# Altium footprint library d1_PcbLib.PcbLib: 266 footprints (part 2 of 17)
Each footprint in its own frame and in the unit in brackets; x right, y up, seen from the top. Pads: shape width x height; smd on the part's side, far side on the other; paste and mask are expansions set on the pad; w line width, h text height; cw(c..) or ccw(c..) is an arc to the next point about the centre after c.
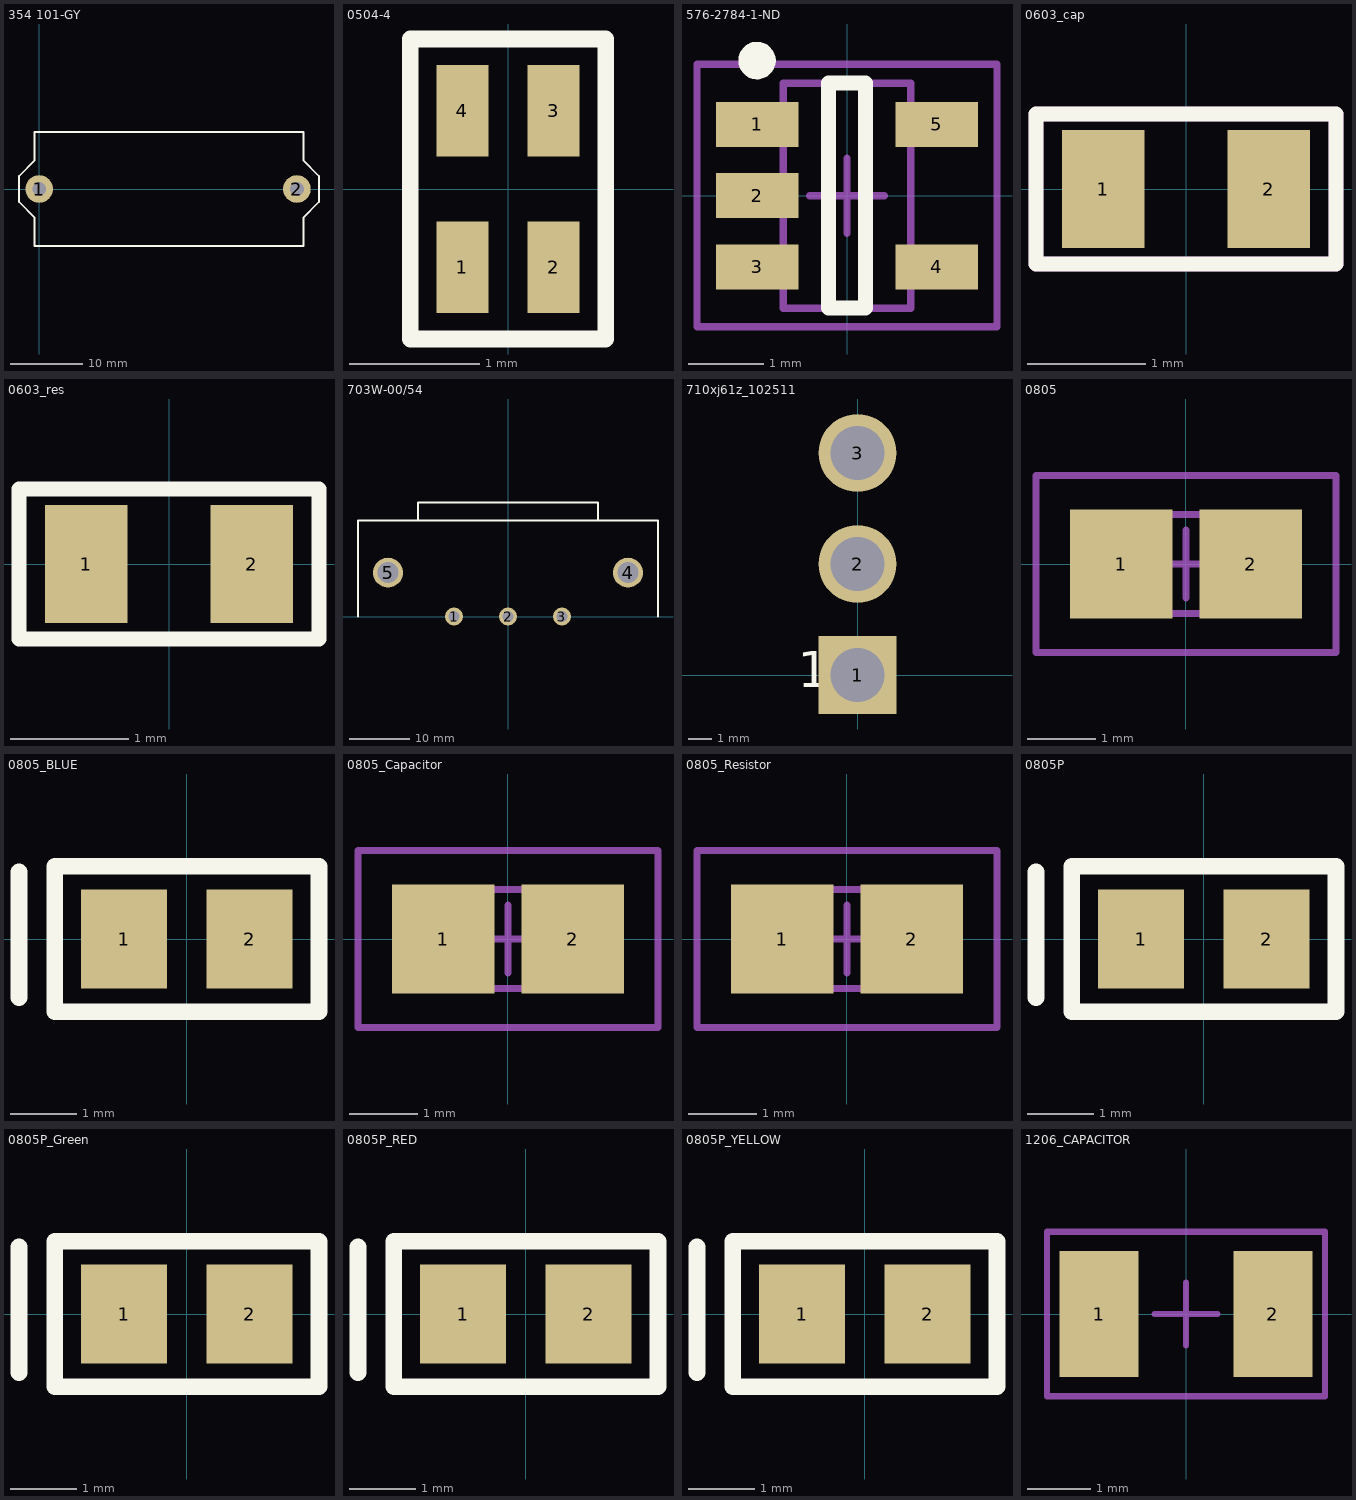
[diagram p1: the footprints below, top view; thin cyan lines are the x and y axes]

## 354 101-GY [mm]
pads (2):
  round 3.81 hole 1.905: 1(0,0) 2(35.56,0)
Top Overlay:
  lines w0.254: -2.794,-1.778 -0.635,-3.937 -0.635,-7.874 36.449,-7.874 36.449,-3.937 38.608,-1.778 38.608,1.778 36.449,3.937 36.449,7.874 -0.635,7.874 -0.635,3.937 -2.794,1.778 -2.794,-1.778
3D body: height 13.46, standoff 0, extent -0.635,-7.938 36.449,7.938

## 0504-4 [mm]
pads (4):
  rect 0.4x0.7 smd: 1(-0.35,-0.6) 2(0.35,-0.6) 3(0.35,0.6) 4(-0.35,0.6)
Top Overlay:
  lines w0.127: -0.75,-1.15 0.75,-1.15 0.75,1.15 -0.75,1.15 -0.75,-1.15

## 576-2784-1-ND [mm] "SOT23, 5-Leads, Body 3.0x3.0mm (max), Pitch 0.95mm, IPC Medium Density"
height 1.45
pads (5):
  rect 1.1x0.6 smd: 1(-1.2,0.95) 2(-1.2,0) 3(-1.2,-0.95) 4(1.2,-0.95) 5(1.2,0.95)
Top Overlay:
  circle w0.25: c-1.2,1.8 r0.125
  lines w0.2: -0.25,-1.5 0.25,-1.5 0.25,1.5 -0.25,1.5 -0.25,-1.5
Mechanical 13:
  lines w0.1: -0.85,-1.5 -0.85,1.5 0.85,1.5 0.85,-1.5 -0.85,-1.5
Mechanical 15:
  lines w0.1: -0.5,0 0.5,0 ; 0,-0.5 0,0.5 ; -2,-1.75 -2,1.75 2,1.75 2,-1.75 -2,-1.75
3D body: height 1.45, standoff 0.15, extent -0.85,-1.5 0.85,1.5

## 0603_cap [mm]
pads (2):
  rect 0.7x1 smd: 1(-0.7,0) 2(0.7,0)
Top Overlay:
  lines w0.127: -1.27,-0.635 1.27,-0.635 1.27,0.635 -1.27,0.635 -1.27,-0.635
Mechanical 15:
  lines w0.127: -1.27,-0.635 1.27,-0.635 1.27,0.635 -1.27,0.635 -1.27,-0.635
3D body: height 0.3, standoff 0, extent -0.8,-0.4 0.8,0.4

## 0603_res [mm]
pads (2):
  rect 0.7x1 smd: 1(-0.7,0) 2(0.7,0)
Top Overlay:
  lines w0.127: -1.27,-0.635 1.27,-0.635 1.27,0.635 -1.27,0.635 -1.27,-0.635
Mechanical 15:
  lines w0.1: -1.27,-0.635 -1.27,0.635 1.27,0.635 1.27,-0.635 -1.27,-0.635
3D body: height 0.3, standoff 0, extent -0.8,-0.4 0.8,0.4

## 703W-00/54 [mm]
pads (5):
  round 3 hole 1.8: 1(-9,0) 2(0,0) 3(9,0)
  round 5 hole 3.5: 4(20,7.3) 5(-20,7.3)
Top Overlay:
  lines w0.254: -25,0 -25,16 25,16 25,0 ; -15,16 -15,19 15,19 15,16

## 710xj61z_102511 [mil]
pads (3):
  rect 130x130 hole 90: 1(0,0)
  round 130 hole 90: 2(0,185) 3(0,370)
Top Overlay:
  text "1" at -100,-20 h60
3D body: height 1234.02, standoff -85, extent -307.5,-198.5 307.5,566.5

## 0805 [mm] "0805 Resistor/Capacitor"
height 1.1
pads (2):
  rect 1.5x1.6 smd: 1(-0.95,0) 2(0.95,0)
Mechanical 13:
  lines w0.1: -1.1,-0.725 1.1,-0.725 1.1,0.725 -1.1,0.725 -1.1,-0.725
Mechanical 15:
  lines w0.1: -0.5,0 0.5,0 ; 0,-0.5 0,0.5 ; -2.2,-1.3 2.2,-1.3 2.2,1.3 -2.2,1.3 -2.2,-1.3
3D body: height 0.78, standoff 0, extent -1,-0.625 1,0.625

## 0805_BLUE [mm] "Chip Capacitor; Body 2.0 x 1.2 mm (LxW typ)"
height 1.3
pads (2):
  rect 1.3x1.5 smd: 1(-0.95,0) 2(0.95,0)
Top Overlay:
  lines w0.254: -2.54,-0.889 -2.54,1.016 ; -2,-1.1 -2,1.1 2,1.1 2,-1.1 0.9,-1.1 -0.9,-1.1 -2,-1.1
3D body: height 0.79, standoff 0, extent -1.016,-0.635 0.991,0.61

## 0805_Capacitor [mm] "0805 Capacitor"
height 1.1
pads (2):
  rect 1.5x1.6 smd: 1(-0.95,0) 2(0.95,0)
Mechanical 13:
  lines w0.1: -1.1,-0.725 -1.1,0.725 1.1,0.725 1.1,-0.725 -1.1,-0.725
Mechanical 15:
  lines w0.1: -0.5,0 0.5,0 ; 0,-0.5 0,0.5 ; -2.2,-1.3 -2.2,1.3 2.2,1.3 2.2,-1.3 -2.2,-1.3
3D body: height 0.76, standoff -0.03, extent -1,-0.625 1,0.625

## 0805_Resistor [mm] "0805 Resistor"
height 1.1
pads (2):
  rect 1.5x1.6 smd: 1(-0.95,0) 2(0.95,0)
Mechanical 13:
  lines w0.1: -1.1,-0.725 1.1,-0.725 1.1,0.725 -1.1,0.725 -1.1,-0.725
Mechanical 15:
  lines w0.1: -0.5,0 0.5,0 ; 0,-0.5 0,0.5 ; -2.2,-1.3 2.2,-1.3 2.2,1.3 -2.2,1.3 -2.2,-1.3
3D body: height 0.78, standoff 0, extent -1,-0.625 1,0.625

## 0805P [mm] "Chip Capacitor; Body 2.0 x 1.2 mm (LxW typ)"
height 1.3
pads (2):
  rect 1.3x1.5 smd: 1(-0.95,0) 2(0.95,0)
Top Overlay:
  lines w0.254: -2.54,-0.889 -2.54,1.016 ; -2,-1.1 -2,1.1 2,1.1 2,-1.1 0.9,-1.1 -0.9,-1.1 -2,-1.1
3D body: height 1.27, standoff 0, extent -1.016,-0.635 1.016,0.635

## 0805P_Green [mm] "Chip Capacitor; Body 2.0 x 1.2 mm (LxW typ)"
height 1.3
pads (2):
  rect 1.3x1.5 smd: 1(-0.95,0) 2(0.95,0)
Top Overlay:
  lines w0.254: -2.54,-0.889 -2.54,1.016 ; -2,-1.1 -2,1.1 2,1.1 2,-1.1 0.9,-1.1 -0.9,-1.1 -2,-1.1
3D body: height 0.79, standoff 0, extent -1.016,-0.635 0.991,0.61

## 0805P_RED [mm] "Chip Capacitor; Body 2.0 x 1.2 mm (LxW typ)"
height 1.3
pads (2):
  rect 1.3x1.5 smd: 1(-0.95,0) 2(0.95,0)
Top Overlay:
  lines w0.254: -2.54,-0.889 -2.54,1.016 ; -2,-1.1 -0.9,-1.1 0.9,-1.1 2,-1.1 2,1.1 -2,1.1 -2,-1.1
3D body: height 0.79, standoff 0, extent -1.016,-0.635 0.991,0.61

## 0805P_YELLOW [mm] "Chip Capacitor; Body 2.0 x 1.2 mm (LxW typ)"
height 1.3
pads (2):
  rect 1.3x1.5 smd: 1(-0.95,0) 2(0.95,0)
Top Overlay:
  lines w0.254: -2.54,-0.889 -2.54,1.016 ; -2,-1.1 -0.9,-1.1 0.9,-1.1 2,-1.1 2,1.1 -2,1.1 -2,-1.1
3D body: height 0.79, standoff 0, extent -1.016,-0.635 0.991,0.61

## 1206_CAPACITOR [mm] "1206 Resistor/Capacitor"
height 1.1
pads (2):
  rect 1.25x2 smd: 1(-1.375,0) 2(1.375,0)
Mechanical 15:
  lines w0.1: -0.5,0 0.5,0 ; 0,-0.5 0,0.5 ; -2.2,-1.3 -2.2,1.3 2.2,1.3 2.2,-1.3 -2.2,-1.3
3D body: height 1, standoff 0, extent -1.6,-0.8 1.6,0.8